# Altium footprint library FujinLib.PcbLib: 106 footprints (part 2 of 7)
Each footprint in its own frame and in the unit in brackets; x right, y up, seen from the top. Pads: shape width x height; smd on the part's side, far side on the other; paste and mask are expansions set on the pad; w line width, h text height; cw(c..) or ccw(c..) is an arc to the next point about the centre after c.
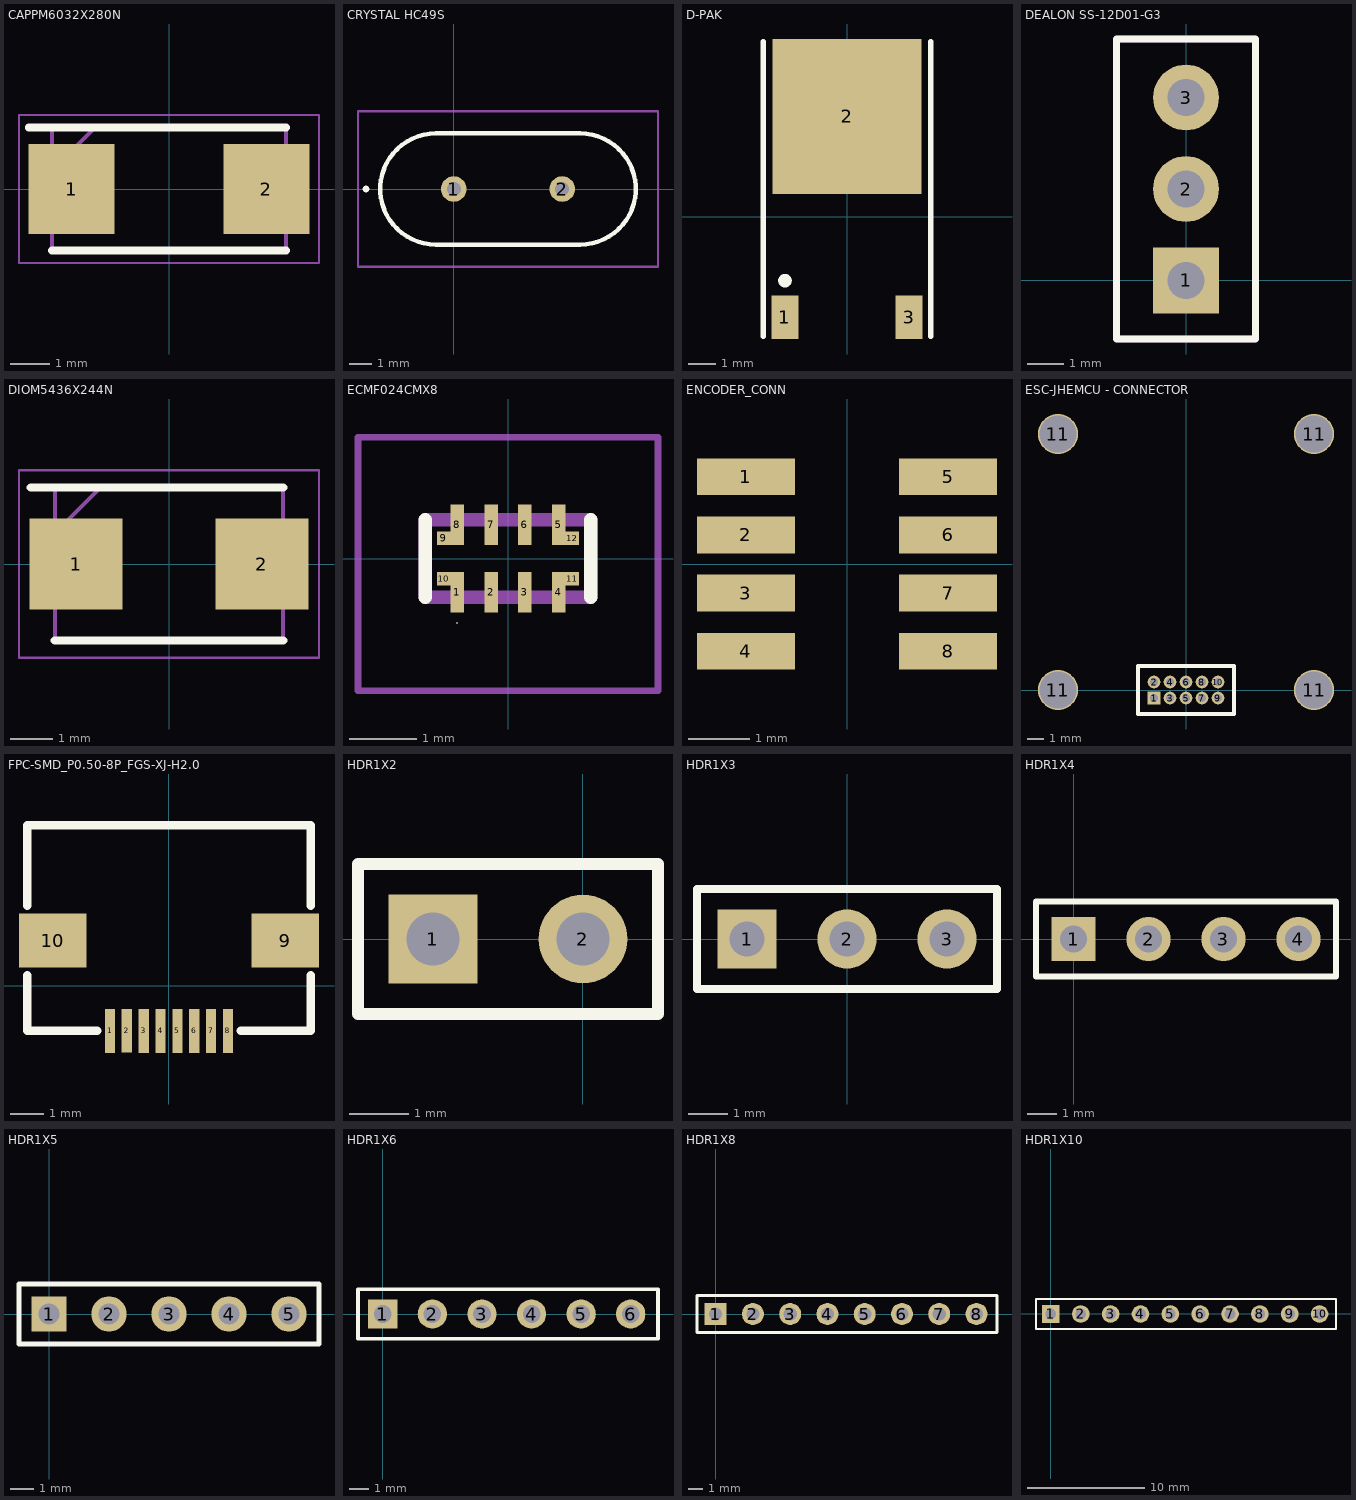
[diagram p1: the footprints below, top view; thin cyan lines are the x and y axes]

## CAPPM6032X280N [mm]
pads (2):
  rect 2.2x2.3 smd: 1(-2.5,0) 2(2.5,0)
Top Overlay:
  lines w0.2: -3.6,1.575 3,1.575 ; -3,-1.575 3,-1.575
Mechanical 13:
  lines w0.1: -3,0.475 -1.9,1.575 ; -3,-1.575 -3,1.575 3,1.575 3,-1.575 -3,-1.575
Mechanical 15:
  lines w0.05: -3.85,-1.9 -3.85,1.9 3.85,1.9 3.85,-1.9 -3.85,-1.9
3D body "TAJC226K016RNJ.stp": height 2.8, standoff 0, extent -3,-1.575 3,1.575

## CRYSTAL HC49S [mm]
pads (2):
  round 1.155 hole 0.63: 1(0,0) 2(4.88,0)
Top Overlay:
  lines w0.2: -4,0 ccw(c-3.95,0) -3.9,0 ; -4,0 cw(c-3.95,0) -3.9,0 ; -4,0 ccw(c-3.95,0) -3.9,0 ; -0.81,-2.5 cw(c-0.81,0) -0.81,2.5 5.69,2.5 cw(c5.69,0) 5.69,-2.5 -0.81,-2.5
Mechanical 13:
  lines w0.1: -0.81,-2.5 cw(c-0.81,0) -0.81,2.5 5.69,2.5 cw(c5.69,0) 5.69,-2.5 -0.81,-2.5
Mechanical 15:
  lines w0.1: -4.31,-3.5 9.19,-3.5 9.19,3.5 -4.31,3.5 -4.31,-3.5
3D body "9B-8.000MEEJ-B.stp": height 3.78, standoff -5, extent -3.31,-2.5 8.19,2.5

## D-PAK [mm] "D-PAK/TO-252-AA; 3 Leads (1 Cropped); Body 10.3 (inc. leads) x 6.7 mm (LxW max)"
height 2.38
pads (3):
  rect 1x1.6 smd: 1(-2.285,-3.7) 3(2.285,-3.7)
  rect 5.5x5.7 smd: 2(0,3.7)
Top Overlay:
  circle w0.25: c-2.285,-2.35 r0.125
  lines w0.2: -3.085,-4.4 -3.085,6.45 ; 3.085,-4.4 3.085,6.45
3D body "d-pak.STEP": height 2.34, standoff -0.08, extent -3.277,-4.385 3.263,5.553

## DEALON SS-12D01-G3 [mm]
pads (3):
  rect 1.8x1.8 hole 1: 1(0,0)
  round 1.8 hole 1: 2(0,2.5) 3(0,5)
Top Overlay:
  lines w0.2: -1.9,-1.6 -1.9,6.6 1.9,6.6 1.9,-1.6 -1.9,-1.6
Mechanical 13:
  lines w0.2: -1.9,-1.6 -1.9,6.6 1.9,6.6 1.9,-1.6 -1.9,-1.6
3D body: height 3, standoff -0.5, extent -0.244,4.703 0.254,5.203
3D body: height 3, standoff -0.5, extent -0.248,2.251 0.25,2.75
3D body: height 3, standoff -0.5, extent -0.249,-0.249 0.249,0.25
3D body: height 6, standoff 3, extent -0.762,0.659 0.738,2.159
3D body: height 3.6, standoff 3.5, extent -0.762,2.159 0.762,4.445
3D body: height 3.5, standoff 0, extent -1.9,-1.6 1.9,6.6

## DIOM5436X244N [mm]
pads (2):
  rect 2.2x2.15 smd: 1(-2.2,0) 2(2.2,0)
Top Overlay:
  lines w0.2: -3.275,1.81 2.7,1.81 ; -2.7,-1.81 2.7,-1.81
Mechanical 13:
  lines w0.1: -2.7,0.735 -1.625,1.81 ; -2.7,-1.81 -2.7,1.81 2.7,1.81 2.7,-1.81 -2.7,-1.81
Mechanical 15:
  lines w0.05: -3.55,-2.22 -3.55,2.22 3.55,2.22 3.55,-2.22 -3.55,-2.22
3D body "SMBJ18A.stp": height 2.44, standoff 0, extent -2.7,-1.81 2.7,1.81

## ECMF024CMX8 [mm]
pads (12):
  rect 0.2x0.6 smd: 1(-0.75,-0.5) 2(-0.25,-0.5) 3(0.25,-0.5) 4(0.75,-0.5) 5(0.75,0.5) 6(0.25,0.5) 7(-0.25,0.5) 8(-0.75,0.5)
  rect 0.2x0.2 smd: 9(-0.95,0.3) 10(-0.95,-0.3) 11(0.95,-0.3) 12(0.95,0.3)
Top Overlay:
  lines w0.01: -0.76,-0.955 ccw(c-0.755,-0.955) -0.75,-0.955 ccw(c-0.755,-0.955) -0.76,-0.955
  lines w0.2: -1.225,-0.575 -1.225,0.575 ; 1.225,-0.575 1.225,0.575
Mechanical 13:
  lines w0.2: -1.225,-0.575 -1.225,0.575 1.225,0.575 1.225,-0.575 -1.225,-0.575
Mechanical 15:
  lines w0.1: -2.225,-1.96 -2.225,1.8 2.225,1.8 2.225,-1.96 -2.225,-1.96
3D body "ECMF02-4CMX8.stp": height 0.52, standoff 0, extent -1.25,-0.6 1.25,0.6

## ENCODER_CONN [mm]
pads (8):
  rect 1.6x0.6 smd: 1(-1.65,1.425) 2(-1.65,0.475) 3(-1.65,-0.475) 4(-1.65,-1.425) 5(1.65,1.425) 6(1.65,0.475) 7(1.65,-0.475) 8(1.65,-1.425)

## ESC-JHEMCU - CONNECTOR [mm] "HDR2X5 1mm"
pads (14):
  rect 0.8x0.8 hole 0.5: 1(-2,-0.5)
  round 0.8 hole 0.5: 2(-2,0.5) 3(-1,-0.5) 4(-1,0.5) 5(0,-0.5) 6(0,0.5) 7(1,-0.5) 8(1,0.5) 9(2,-0.5) 10(2,0.5)
  round 2.5 hole 2.3: 11(-8,0) 11(-8,16) 11(8,0) 11(8,16)
Top Overlay:
  lines w0.254: -3,-1.5 3,-1.5 3,1.5 -3,1.5 -3,-1.5
3D body: height 5, standoff 4, extent -12.5,-3.8 12.5,20.2
3D body: height 4, standoff 1, extent -2.984,-1.46 2.984,1.46

## FPC-SMD_P0.50-8P_FGS-XJ-H2.0 [mm]
pads (10):
  rect 0.3x1.3 smd: 1(-1.75,-1.34) 2(-1.252,-1.338) 3(-0.75,-1.34) 4(-0.25,-1.34) 5(0.25,-1.34) 6(0.75,-1.34) 7(1.25,-1.34) 8(1.75,-1.34)
  rect 2x1.6 smd: 9(3.45,1.34) 10(-3.45,1.34)
Top Overlay:
  lines w0.254: -4.202,0.309 -4.202,-1.34 -2.131,-1.34 ; -4.202,2.371 -4.202,4.76 4.202,4.76 4.202,2.371 ; 2.131,-1.34 4.202,-1.34 4.202,0.309
3D body: height 1.5, standoff 0, extent -4.191,-1.27 4.064,4.826

## HDR1X2 [mm]
pads (2):
  rect 1.5x1.5 hole 0.9: 1(-2.54,0)
  round 1.5 hole 0.9: 2(0,0)
Top Overlay:
  lines w0.2: -3.81,-1.27 1.27,-1.27 1.27,1.27 -3.81,1.27 -3.81,-1.27

## HDR1X3 [mm]
pads (3):
  rect 1.5x1.5 hole 0.9: 1(-2.54,0)
  round 1.5 hole 0.9: 2(0,0) 3(2.54,0)
Top Overlay:
  lines w0.2: -3.81,-1.27 -3.81,1.27 3.81,1.27 3.81,-1.27 -3.81,-1.27

## HDR1X4 [mm]
pads (4):
  rect 1.5x1.5 hole 0.9: 1(0,0)
  round 1.5 hole 0.9: 2(2.54,0) 3(5.08,0) 4(7.62,0)
Top Overlay:
  lines w0.2: -1.27,-1.27 -1.27,1.27 8.89,1.27 8.89,-1.27 -1.27,-1.27

## HDR1X5 [mm]
pads (5):
  rect 1.5x1.5 hole 0.9: 1(0,0)
  round 1.5 hole 0.9: 2(2.54,0) 3(5.08,0) 4(7.62,0) 5(10.16,0)
Top Overlay:
  lines w0.2: -1.27,-1.27 11.43,-1.27 11.43,1.27 -1.27,1.27 -1.27,-1.27

## HDR1X6 [mm]
pads (6):
  rect 1.5x1.5 hole 0.9: 1(0,0)
  round 1.5 hole 0.9: 2(2.54,0) 3(5.08,0) 4(7.62,0) 5(10.16,0) 6(12.7,0)
Top Overlay:
  lines w0.2: -1.27,-1.27 -1.27,1.27 14.097,1.27 14.097,-1.27 -1.27,-1.27

## HDR1X8 [mm]
pads (8):
  rect 1.5x1.5 hole 0.9: 1(0,0)
  round 1.5 hole 0.9: 2(2.54,0) 3(5.08,0) 4(7.62,0) 5(10.16,0) 6(12.7,0) 7(15.24,0) 8(17.78,0)
Top Overlay:
  lines w0.2: -1.27,-1.27 -1.27,1.27 11.557,1.27 19.177,1.27 19.177,-1.27 11.557,-1.27 -1.27,-1.27

## HDR1X10 [mm]
pads (10):
  rect 1.5x1.5 hole 0.9: 1(0,0)
  round 1.5 hole 0.9: 2(2.54,0) 3(5.08,0) 4(7.62,0) 5(10.16,0) 6(12.7,0) 7(15.24,0) 8(17.78,0) 9(20.32,0) 10(22.86,0)
Top Overlay:
  lines w0.2: -1.27,-1.27 -1.27,1.27 11.557,1.27 24.257,1.27 24.257,-1.27 11.557,-1.27 -1.27,-1.27